# Altium footprint library LC-Standard-FootPrints-AD-V1.01.PcbLib: 555 footprints (part 35 of 35)
Each footprint in its own frame and in the unit in brackets; x right, y up, seen from the top. Pads: shape width x height; smd on the part's side, far side on the other; paste and mask are expansions set on the pad; w line width, h text height; cw(c..) or ccw(c..) is an arc to the next point about the centre after c.
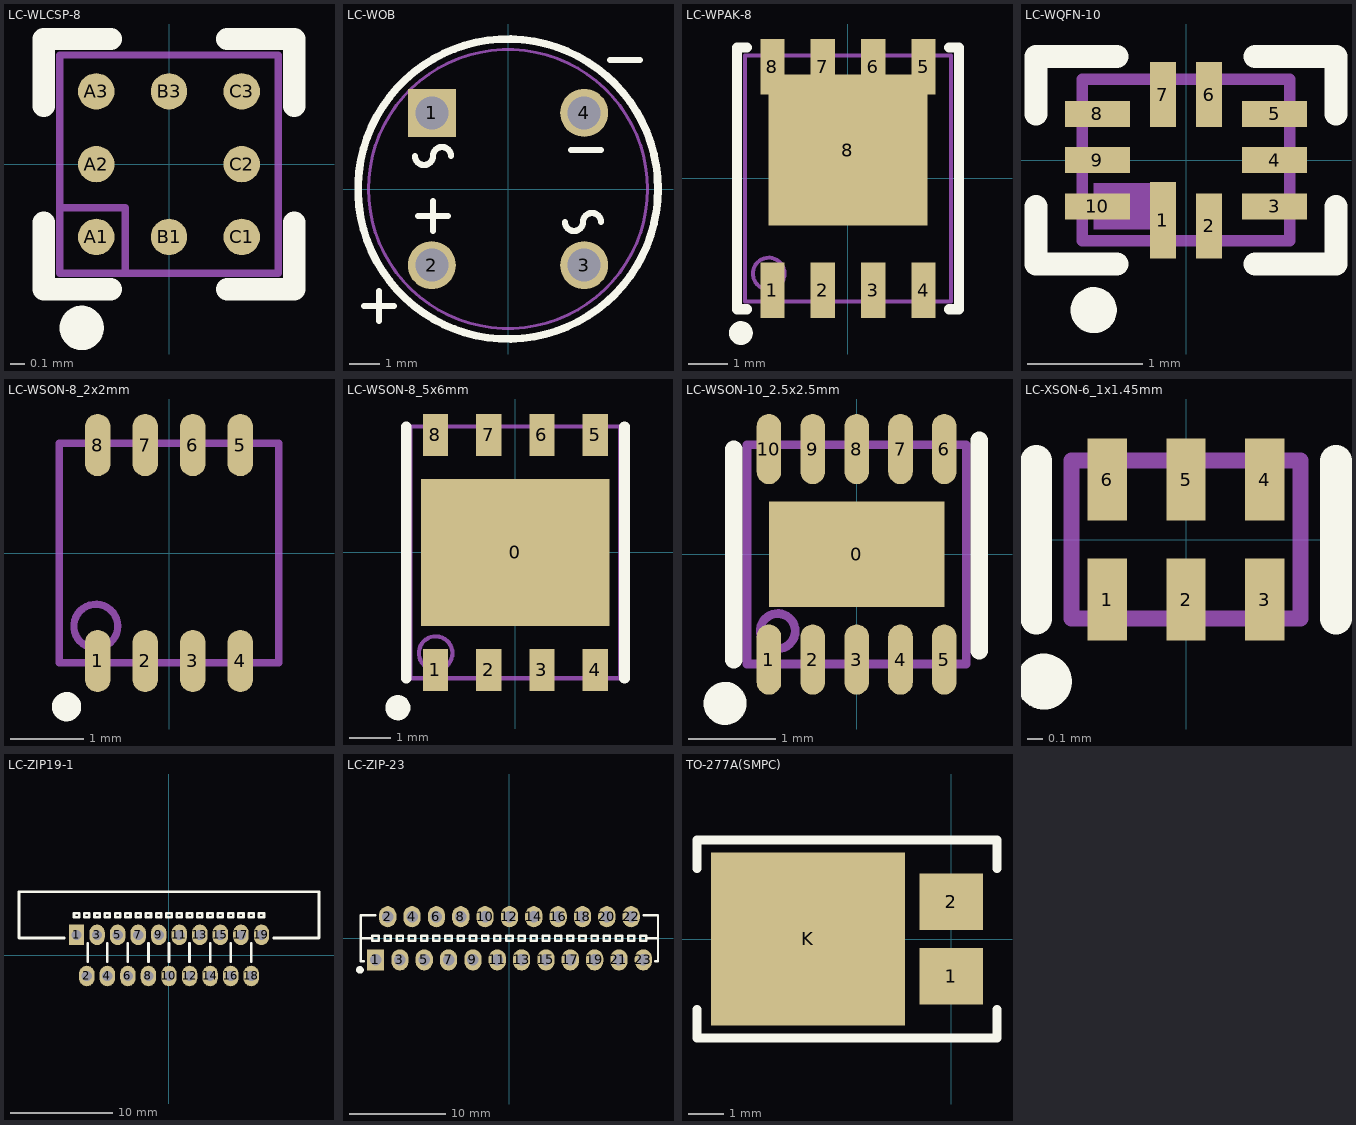
[diagram p34: the footprints below, top view; thin cyan lines are the x and y axes]

## LC-WLCSP-8 [mm]
pads (8):
  round 0.25 smd mask+0.051: A1(-0.5,-0.5) A2(-0.5,0) A3(-0.5,0.5) B1(0,-0.5) B3(0,0.5) C1(0.5,-0.5) C2(0.5,0) C3(0.5,0.5)
Top Overlay:
  circle w0.152: c-0.6,-1.125 r0.076
  lines w0.152: -0.86,-0.4 -0.86,-0.86 -0.4,-0.86 ; -0.86,0.4 -0.86,0.86 -0.4,0.86 ; 0.4,-0.86 0.86,-0.86 0.86,-0.4 ; 0.4,0.86 0.86,0.86 0.86,0.4
Mechanical 13:
  lines w0.05: -0.75,-0.3 -0.3,-0.3 -0.3,-0.75 ; -0.75,-0.75 -0.75,0.75 0.75,0.75 0.75,-0.75 -0.75,-0.75

## LC-WOB [mm]
pads (4):
  rect 1.6x1.6 hole 1.1: 1(-2.54,2.54)
  round 1.6 hole 1.1: 2(-2.54,-2.54) 3(2.54,-2.54) 4(2.54,2.54)
Top Overlay:
  circle w0.254: c0,0 r5
  lines w0.203: -4.8,-3.9 -3.8,-3.9 ; -4.3,-4.4 -4.3,-3.4 ; -3.1,1.1 ccw(c-2.8,1.1) -2.5,1.1 cw(c-2.2,1.1) -1.9,1.1 ; -3,-0.9 -2,-0.9 ; -2.5,-1.4 -2.5,-0.4 ; 1.9,-1.1 ccw(c2.2,-1.1) 2.5,-1.1 cw(c2.8,-1.1) 3.1,-1.1 ; 2.1,1.3 3.1,1.3 ; 3.4,4.3 4.4,4.3
Mechanical 13:
  circle w0.1: c0,0 r4.65

## LC-WPAK-8 [mm]
pads (9):
  rect 0.61x1.4 smd: 1(-1.905,-2.816) 2(-0.635,-2.816) 3(0.635,-2.816) 4(1.905,-2.816) 5(1.905,2.816) 6(0.635,2.816) 7(-0.635,2.816) 8(-1.905,2.816)
  rect 4x3.81 smd: 8(0,0.716)
Top Overlay:
  circle w0.3: c-2.7,-3.9 r0.15
  lines w0.254: -2.55,-3.3 -2.8,-3.3 -2.8,3.3 -2.55,3.3 ; 2.55,-3.3 2.8,-3.3 2.8,3.3 2.55,3.3
Mechanical 13:
  circle w0.1: c-2,-2.4 r0.4
  lines w0.1: -2.6,-3.1 2.6,-3.1 2.6,3.1 -2.6,3.1 -2.6,-3.1

## LC-WQFN-10 [mm]
pads (10):
  rect 0.225x0.663 smd mask+0.051: 1(-0.2,-0.519)
  rect 0.225x0.563 smd mask+0.051: 2(0.2,-0.569) 6(0.2,0.569) 7(-0.2,0.569)
  rect 0.563x0.225 smd mask+0.051: 3(0.768,-0.4) 4(0.768,0) 5(0.768,0.4) 8(-0.768,0.4) 9(-0.768,0) 10(-0.768,-0.4)
Top Overlay:
  circle w0.2: c-0.8,-1.3 r0.1
  lines w0.2: -1.3,-0.4 -1.3,-0.9 -0.6,-0.9 ; -1.3,0.4 -1.3,0.9 -0.6,0.9 ; 0.6,-0.9 1.3,-0.9 1.3,-0.4 ; 0.6,0.9 1.3,0.9 1.3,0.4
Mechanical 13:
  region: -0.3,-0.6 -0.3,-0.2 -0.8,-0.2 -0.8,-0.6
  lines w0.1: -0.9,-0.7 0.9,-0.7 0.9,0.7 -0.9,0.7 -0.9,-0.7

## LC-WSON-8_2x2mm [mm]
pads (8):
  oval 0.35x0.85 smd mask+0.051: 1(-0.975,-1.475) 2(-0.325,-1.475) 3(0.325,-1.475) 4(0.975,-1.475) 5(0.975,1.475) 6(0.325,1.475) 7(-0.325,1.475) 8(-0.975,1.475)
Top Overlay:
  circle w0.2: c-1.4,-2.1 r0.1
Mechanical 13:
  circle w0.1: c-1,-1 r0.3
  lines w0.1: -1.5,-1.5 1.5,-1.5 1.5,1.5 -1.5,1.5 -1.5,-1.5

## LC-WSON-8_5x6mm [mm]
pads (9):
  rect 4.5x3.5 smd: 0(0,0)
  rect 0.6x1 smd: 1(-1.905,-2.8) 2(-0.635,-2.8) 3(0.635,-2.8) 4(1.905,-2.8) 5(1.905,2.8) 6(0.635,2.8) 7(-0.635,2.8) 8(-1.905,2.8)
Top Overlay:
  circle w0.3: c-2.8,-3.7 r0.15
  lines w0.254: -2.6,-3 -2.6,3 ; 2.6,-3 2.6,3
Mechanical 13:
  circle w0.1: c-1.9,-2.4 r0.4
  lines w0.1: -2.5,-3 -2.5,3 2.5,3 2.5,-3 -2.5,-3

## LC-WSON-10_2.5x2.5mm [mm]
pads (11):
  rect 2x1.2 smd mask+0.051: 0(0,0)
  oval 0.28x0.8 smd paste-0.025 mask+0.051: 1(-1,-1.2) 2(-0.5,-1.2) 3(0,-1.2) 4(0.5,-1.2) 5(1,-1.2) 6(1,1.2) 7(0.5,1.2) 8(0,1.2) 9(-0.5,1.2) 10(-1,1.2)
Top Overlay:
  circle w0.25: c-1.5,-1.7 r0.12
  lines w0.2: -1.4,-1.2 -1.4,1.2 ; 1.4,-1.1 1.4,1.3
Mechanical 13:
  circle w0.1: c-0.9,-0.875 r0.2
  lines w0.1: -1.25,-1.25 1.25,-1.25 1.25,1.25 -1.25,1.25 -1.25,-1.25

## LC-XSON-6_1x1.45mm [mm]
pads (6):
  rect 0.25x0.52 smd mask+0.051: 1(-0.5,-0.38) 2(0,-0.38) 3(0.5,-0.38) 4(0.5,0.38) 5(0,0.38) 6(-0.5,0.38)
Top Overlay:
  circle w0.254: c-0.9,-0.9 r0.05
  lines w0.2: -0.95,-0.5 -0.95,0.5 ; 0.95,-0.5 0.95,0.5
Mechanical 13:
  lines w0.1: -0.725,-0.5 0.725,-0.5 0.725,0.5 -0.725,0.5 -0.725,-0.5

## LC-ZIP19-1 [mm]
pads (19):
  rect 1.5x2 hole 1: 1(-9,2)
  oval 1.5x2 hole 1: 2(-8,-2) 3(-7,2) 4(-6,-2) 5(-5,2) 6(-4,-2) 7(-3,2) 8(-2,-2) 9(-1,2) 10(0,-2) 11(1,2) 12(2,-2) 13(3,2) 14(4,-2) 15(5,2) 16(6,-2) 17(7,2) 18(8,-2) 19(9,2)
Top Overlay:
  lines w0.254: -10.2,1.7 -14.6,1.7 -14.6,6.2 14.6,6.2 14.6,1.7 10.2,1.7 ; -7.9,-0.6 -7.9,1.2 ; -6,-0.6 -6,1.2 ; -4,-0.6 -4,1.2 ; -2,-0.6 -2,1.2 ; 0,-0.6 0,1.2 ; 2,-0.6 2,1.2 ; 4,-0.6 4,1.2 ; 6,-0.6 6,1.2 ; 8,-0.6 8,1.2 ; -9.25,3.7 -9.25,4.1 -8.75,4.1 -8.75,3.7 -9.25,3.7 ; -8.25,3.7 -7.75,3.7 -7.75,4.1 -8.25,4.1 -8.25,3.7 ; -7.25,3.7 -7.25,4.1 -6.75,4.1 -6.75,3.7 -7.25,3.7 ; -6.25,3.7 -5.75,3.7 -5.75,4.1 -6.25,4.1 -6.25,3.7 ; -5.25,3.7 -5.25,4.1 -4.75,4.1 -4.75,3.7 -5.25,3.7 ; -4.25,3.7 -3.75,3.7 -3.75,4.1 -4.25,4.1 -4.25,3.7 ; -3.25,3.7 -3.25,4.1 -2.75,4.1 -2.75,3.7 -3.25,3.7 ; -2.25,3.7 -1.75,3.7 -1.75,4.1 -2.25,4.1 -2.25,3.7 ; -1.25,3.7 -0.75,3.7 -0.75,4.1 -1.25,4.1 -1.25,3.7 ; -0.25,3.7 -0.25,4.1 0.25,4.1 0.25,3.7 -0.25,3.7 ; 0.75,3.7 0.75,4.1 1.25,4.1 1.25,3.7 0.75,3.7 ; 1.75,3.7 2.25,3.7 2.25,4.1 1.75,4.1 1.75,3.7 ; 2.75,3.7 2.75,4.1 3.25,4.1 3.25,3.7 2.75,3.7 ; 3.75,3.7 4.25,3.7 4.25,4.1 3.75,4.1 3.75,3.7 ; 4.75,3.7 4.75,4.1 5.25,4.1 5.25,3.7 4.75,3.7 ; 5.75,3.7 6.25,3.7 6.25,4.1 5.75,4.1 5.75,3.7 ; 6.75,3.7 6.75,4.1 7.25,4.1 7.25,3.7 6.75,3.7 ; 7.75,3.7 8.25,3.7 8.25,4.1 7.75,4.1 7.75,3.7 ; 8.75,3.7 8.75,4.1 9.25,4.1 9.25,3.7 8.75,3.7

## LC-ZIP-23 [mm]
pads (23):
  rect 1.8x2.2 hole 1.2: 1(-13.97,-2.25)
  oval 1.8x2.2 hole 1.2: 2(-12.7,2.25) 3(-11.43,-2.25) 4(-10.16,2.25) 5(-8.89,-2.25) 6(-7.62,2.25) 7(-6.35,-2.25) 8(-5.08,2.25) 9(-3.81,-2.25) 10(-2.54,2.25) 11(-1.27,-2.25) 12(0,2.25) 13(1.27,-2.25) 14(2.54,2.25) 15(3.81,-2.25) 16(5.08,2.25) 17(6.35,-2.25) 18(7.62,2.25) 19(8.89,-2.25) 20(10.16,2.25) 21(11.43,-2.25) 22(12.7,2.25) 23(13.97,-2.25)
Top Overlay:
  circle w0.4: c-15.6,-3.3 r0.2
  lines w0.254: -15.5,0 -14.5,0 ; -15.2,-2.4 -15.5,-2.4 -15.5,2.4 -14,2.4 ; 14,2.4 15.5,2.4 15.5,-2.4 15.2,-2.4 ; 14.5,0 15.5,0 ; -14.295,-0.275 -13.645,-0.275 -13.645,0.275 -14.295,0.275 -14.295,-0.275 ; -13.025,-0.275 -13.025,0.275 -12.375,0.275 -12.375,-0.275 -13.025,-0.275 ; -11.755,-0.275 -11.105,-0.275 -11.105,0.275 -11.755,0.275 -11.755,-0.275 ; -10.485,-0.275 -10.485,0.275 -9.835,0.275 -9.835,-0.275 -10.485,-0.275 ; -9.215,-0.275 -8.565,-0.275 -8.565,0.275 -9.215,0.275 -9.215,-0.275 ; -7.945,-0.275 -7.945,0.275 -7.295,0.275 -7.295,-0.275 -7.945,-0.275 ; -6.675,-0.275 -6.025,-0.275 -6.025,0.275 -6.675,0.275 -6.675,-0.275 ; -5.405,-0.275 -5.405,0.275 -4.755,0.275 -4.755,-0.275 -5.405,-0.275 ; -4.135,-0.275 -3.485,-0.275 -3.485,0.275 -4.135,0.275 -4.135,-0.275 ; -2.865,-0.275 -2.865,0.275 -2.215,0.275 -2.215,-0.275 -2.865,-0.275 ; -1.595,-0.275 -1.595,0.275 -0.945,0.275 -0.945,-0.275 -1.595,-0.275 ; -0.325,-0.275 0.325,-0.275 0.325,0.275 -0.325,0.275 -0.325,-0.275 ; 0.945,-0.275 1.595,-0.275 1.595,0.275 0.945,0.275 0.945,-0.275 ; 2.215,-0.275 2.865,-0.275 2.865,0.275 2.215,0.275 2.215,-0.275 ; 3.485,-0.275 3.485,0.275 4.135,0.275 4.135,-0.275 3.485,-0.275 ; 4.755,-0.275 5.405,-0.275 5.405,0.275 4.755,0.275 4.755,-0.275 ; 6.025,-0.275 6.025,0.275 6.675,0.275 6.675,-0.275 6.025,-0.275 ; 7.295,-0.275 7.945,-0.275 7.945,0.275 7.295,0.275 7.295,-0.275 ; 8.565,-0.275 8.565,0.275 9.215,0.275 9.215,-0.275 8.565,-0.275 ; 9.835,-0.275 10.485,-0.275 10.485,0.275 9.835,0.275 9.835,-0.275 ; 11.105,-0.275 11.105,0.275 11.755,0.275 11.755,-0.275 11.105,-0.275 ; 12.375,-0.275 13.025,-0.275 13.025,0.275 12.375,0.275 12.375,-0.275 ; 13.645,-0.275 14.295,-0.275 14.295,0.275 13.645,0.275 13.645,-0.275

## TO-277A(SMPC) [mm]
pads (3):
  rect 1.8x1.6 smd: 1(0,-1.05) 2(0,1.05)
  rect 5.5x4.9 smd: K(-4.05,0)
Top Overlay:
  lines w0.254: -7.2,-2 -7.2,-2.8 1.3,-2.8 1.3,-2 ; -7.2,2 -7.2,2.8 1.3,2.8 1.3,2
3D body: height 1.2, standoff 0, extent -6.275,-2.375 0.375,2.375